# Altium footprint library PcbLib1.PcbLib: 17 footprints (part 1 of 2)
Each footprint in its own frame and in the unit in brackets; x right, y up, seen from the top. Pads: shape width x height; smd on the part's side, far side on the other; paste and mask are expansions set on the pad; w line width, h text height; cw(c..) or ccw(c..) is an arc to the next point about the centre after c.
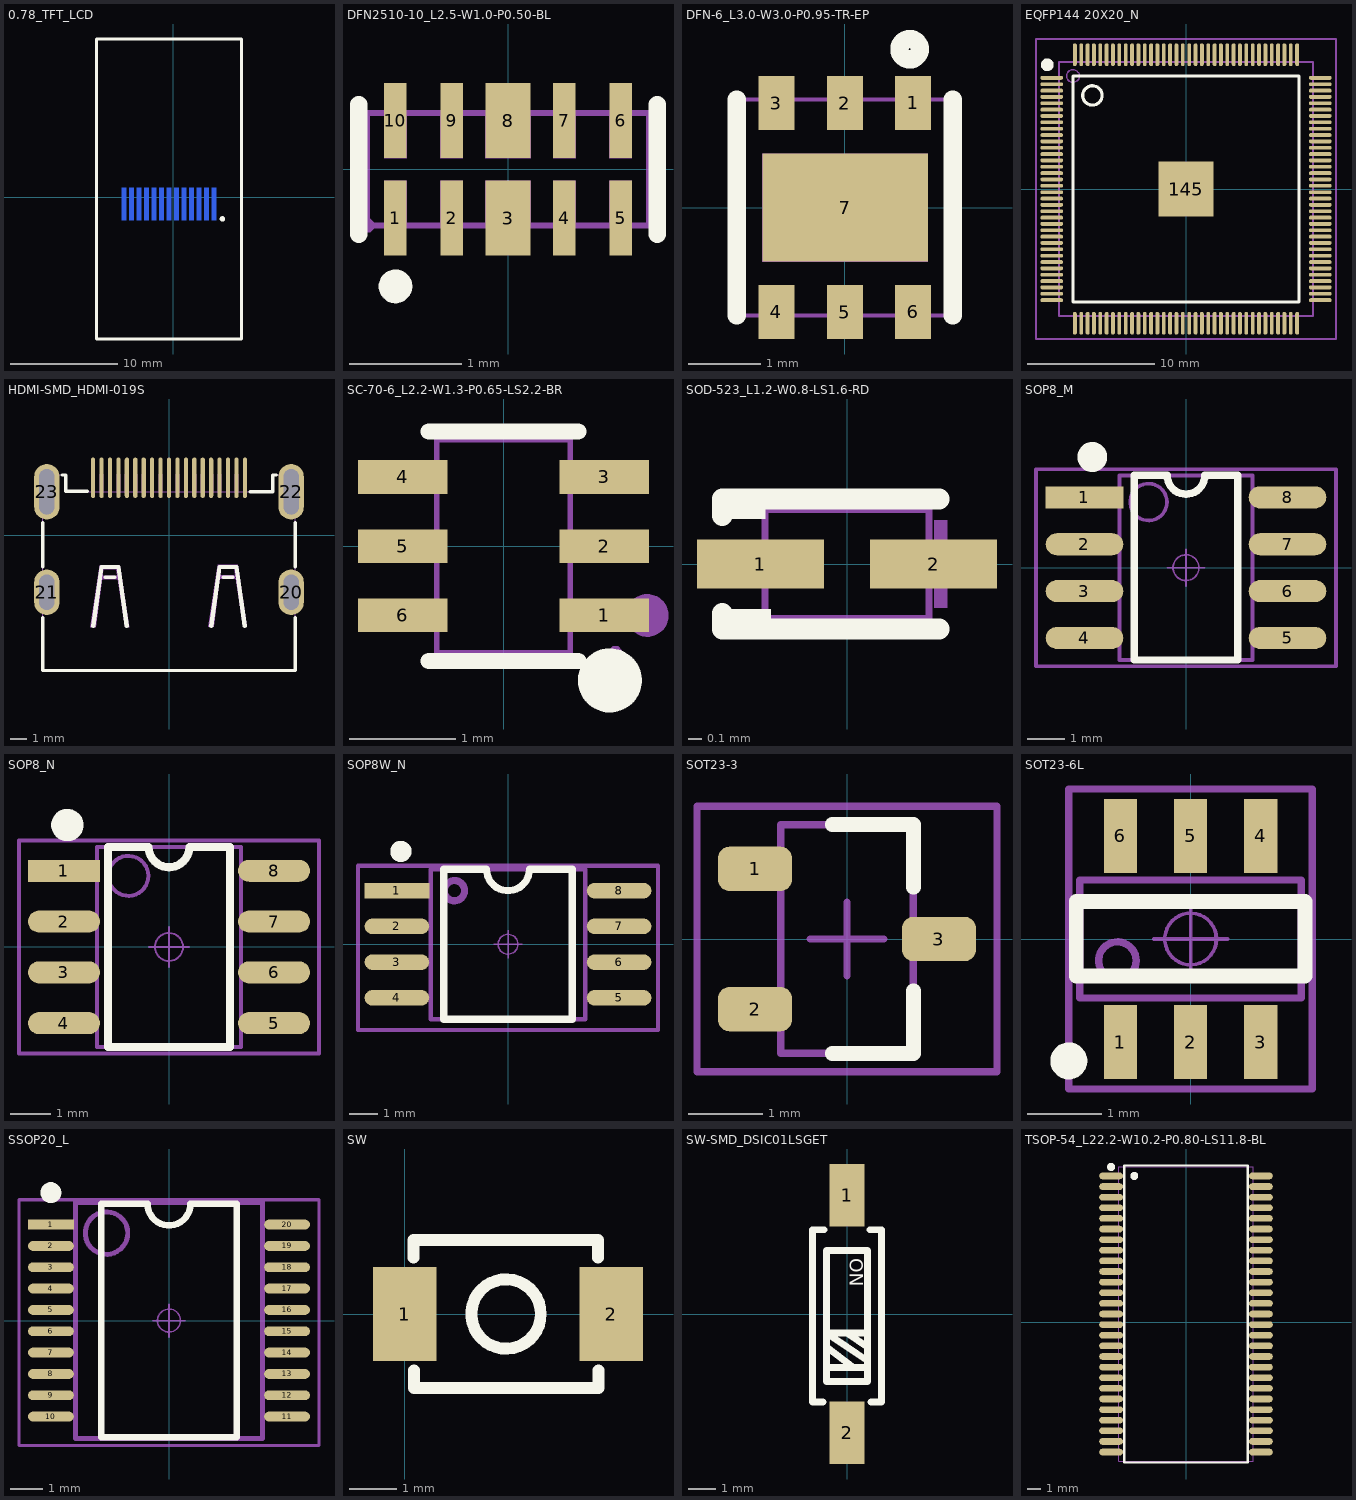
[diagram p0: the footprints below, top view; thin cyan lines are the x and y axes]

## 0.78_TFT_LCD [mm]
pads (13):
  rect 0.4x3 smd far side: 1(3.8,-0.635) 2(3.1,-0.635) 3(2.4,-0.635) 4(1.7,-0.635) 5(1,-0.635) 6(0.3,-0.635) 7(-0.4,-0.635) 8(-1.1,-0.635) 9(-1.8,-0.635) 10(-2.5,-0.635) 11(-3.2,-0.635) 12(-3.9,-0.635) 13(-4.6,-0.635)
Top Overlay:
  circle w0.254: c4.572,-2.032 r0.127
  lines w0.254: -7.15,-13.218 6.35,-13.218 6.35,14.732 -7.15,14.732 -7.15,-13.218

## DFN2510-10_L2.5-W1.0-P0.50-BL [mm]
pads (10):
  rect 0.2x0.665 smd paste-100 mask+0.051: 1(-1,-0.433) 2(-0.5,-0.433) 4(0.5,-0.433) 5(1,-0.433) 6(1,0.433) 7(0.5,0.433) 9(-0.5,0.433) 10(-1,0.433)
  rect 0.4x0.665 smd paste-100 mask+0.051: 3(0,-0.433) 8(0,0.433)
Top Overlay:
  circle w0.15: c-1,-1.04 r0.075
  lines w0.152: -1.326,-0.576 -1.326,0.576 ; 1.326,-0.576 1.326,0.576
Top Paste:
  region: -0.2,-0.1 0.2,-0.1 0.2,-0.765 -0.2,-0.765 -0.2,-0.766
  region: -0.2,0.765 0.2,0.765 0.2,0.1 -0.2,0.1
  region: -0.601,-0.1 -0.4,-0.1 -0.4,-0.765 -0.6,-0.765
  region: -1.101,-0.1 -0.9,-0.1 -0.9,-0.765 -1.1,-0.765
  region: 0.399,-0.1 0.6,-0.1 0.6,-0.765 0.4,-0.765
  region: 0.899,-0.1 1.1,-0.1 1.1,-0.765 0.9,-0.765
  region: 0.899,0.765 1.1,0.765 1.1,0.101 0.9,0.101
  region: 0.399,0.765 0.6,0.765 0.6,0.101 0.4,0.101
  region: -0.601,0.765 -0.4,0.765 -0.4,0.101 -0.6,0.101
  region: -1.101,0.765 -0.9,0.765 -0.9,0.101 -1.1,0.101
Mechanical 15:
  region: -0.2,-0.1 0.2,-0.1 0.2,-0.5 -0.2,-0.5
  region: -0.2,0.5 0.2,0.5 0.2,0.1 -0.2,0.1
  region: -1.1,0.5 -1.1,0.1 -0.9,0.1 -0.9,0.5
  region: -0.6,0.5 -0.6,0.1 -0.4,0.1 -0.4,0.5
  region: 0.4,0.5 0.4,0.1 0.6,0.1 0.6,0.5
  region: 0.9,0.5 0.9,0.1 1.1,0.1 1.1,0.5
  region: 0.9,-0.5 0.9,-0.1 1.1,-0.1 1.1,-0.5
  region: 0.4,-0.5 0.4,-0.1 0.6,-0.1 0.6,-0.5
  region: -0.6,-0.5 -0.6,-0.1 -0.4,-0.1 -0.4,-0.5
  region: -1.1,-0.5 -1.1,-0.1 -0.9,-0.1 -0.9,-0.5
  region: -1.19,-0.5 -1.19,-0.475 -1.225,-0.44 -1.275,-0.44 -1.31,-0.475 -1.31,-0.5 -1.31,-0.525 -1.275,-0.56 -1.225,-0.56 -1.19,-0.525 -1.19,-0.5
  lines w0.051: -1.25,-0.5 1.25,-0.5 1.25,0.5 -1.25,0.5 -1.25,-0.5
3D body "3D_PCB1_2023-04-28.stp": height 0.52, standoff 0, extent -1.25,-0.508 1.25,0.512

## DFN-6_L3.0-W3.0-P0.95-TR-EP [mm]
pads (7):
  rect 0.5x0.75 smd paste+0 mask+0.051: 1(0.95,1.452) 2(0,1.451) 3(-0.95,1.45) 4(-0.95,-1.451) 5(0,-1.452) 6(0.95,-1.451)
  rect 2.3x1.5 smd paste+0 mask+0.051: 7(0.004,-0.001)
Top Overlay:
  circle w0.254: c0.9,2.2 r0.141
  lines w0.254: -1.5,-1.5 -1.5,1.5 ; 1.5,-1.5 1.5,1.5
Mechanical 15:
  region: -0.192,1.499 0.208,1.499 0.208,1.099 -0.192,1.099
  region: 0.758,1.499 1.158,1.499 1.158,1.099 0.758,1.099
  region: -1.142,1.499 -0.742,1.499 -0.742,1.099 -1.142,1.099
  region: 1.15,-1.5 0.75,-1.5 0.75,-1.1 1.15,-1.1
  region: -0.75,-1.5 -1.15,-1.5 -1.15,-1.1 -0.75,-1.1
  region: 0.2,-1.5 -0.2,-1.5 -0.2,-1.1 0.2,-1.1
  region: -1.146,-0.751 -1.146,0.75 1.154,0.75 1.154,-0.751
  region: 1.56,1.5 1.56,1.525 1.525,1.56 1.475,1.56 1.44,1.525 1.44,1.5 1.44,1.475 1.475,1.44 1.525,1.44 1.56,1.475 1.56,1.5
  lines w0.051: -1.5,-1.5 -1.5,1.5 1.5,1.5 1.5,-1.5 -1.5,-1.5
3D body "3D_PCB1_2023-04-28.stp": height 1.01, standoff 0, extent -1.495,-1.507 1.485,1.493

## EQFP144 20X20_N [mm] "144脚，体宽20x20mm，脚距0.5mm"
pads (145):
  oval 1.8x0.3 smd: 1(-10.573,8.75) 2(-10.573,8.25) 3(-10.573,7.75) 4(-10.573,7.25) 5(-10.573,6.75) 6(-10.573,6.25) 7(-10.573,5.75) 8(-10.573,5.25) 9(-10.573,4.75) 10(-10.573,4.25) 11(-10.573,3.75) 12(-10.573,3.25) 13(-10.573,2.75) 14(-10.573,2.25) 15(-10.573,1.75) 16(-10.573,1.25) 17(-10.573,0.75) 18(-10.573,0.25) 19(-10.573,-0.25) 20(-10.573,-0.75) 21(-10.573,-1.25) 22(-10.573,-1.75) 23(-10.573,-2.25) 24(-10.573,-2.75) 25(-10.573,-3.25) 26(-10.573,-3.75) 27(-10.573,-4.25) 28(-10.573,-4.75) 29(-10.573,-5.25) 30(-10.573,-5.75) 31(-10.573,-6.25) 32(-10.573,-6.75) 33(-10.573,-7.25) 34(-10.573,-7.75) 35(-10.573,-8.25) 36(-10.573,-8.75) 73(10.573,-8.75) 74(10.573,-8.25) 75(10.573,-7.75) 76(10.573,-7.25) 77(10.573,-6.75) 78(10.573,-6.25) 79(10.573,-5.75) 80(10.573,-5.25) 81(10.573,-4.75) 82(10.573,-4.25) 83(10.573,-3.75) 84(10.573,-3.25) 85(10.573,-2.75) 86(10.573,-2.25) 87(10.573,-1.75) 88(10.573,-1.25) 89(10.573,-0.75) 90(10.573,-0.25) 91(10.573,0.25) 92(10.573,0.75) 93(10.573,1.25) 94(10.573,1.75) 95(10.573,2.25) 96(10.573,2.75) 97(10.573,3.25) 98(10.573,3.75) 99(10.573,4.25) 100(10.573,4.75) 101(10.573,5.25) 102(10.573,5.75) 103(10.573,6.25) 104(10.573,6.75) 105(10.573,7.25) 106(10.573,7.75) 107(10.573,8.25) 108(10.573,8.75)
  oval 0.3x1.8 smd: 37(-8.75,-10.573) 38(-8.25,-10.573) 39(-7.75,-10.573) 40(-7.25,-10.573) 41(-6.75,-10.573) 42(-6.25,-10.573) 43(-5.75,-10.573) 44(-5.25,-10.573) 45(-4.75,-10.573) 46(-4.25,-10.573) 47(-3.75,-10.573) 48(-3.25,-10.573) 49(-2.75,-10.573) 50(-2.25,-10.573) 51(-1.75,-10.573) 52(-1.25,-10.573) 53(-0.75,-10.573) 54(-0.25,-10.573) 55(0.25,-10.573) 56(0.75,-10.573) 57(1.25,-10.573) 58(1.75,-10.573) 59(2.25,-10.573) 60(2.75,-10.573) 61(3.25,-10.573) 62(3.75,-10.573) 63(4.25,-10.573) 64(4.75,-10.573) 65(5.25,-10.573) 66(5.75,-10.573) 67(6.25,-10.573) 68(6.75,-10.573) 69(7.25,-10.573) 70(7.75,-10.573) 71(8.25,-10.573) 72(8.75,-10.573) 109(8.75,10.573) 110(8.25,10.573) 111(7.75,10.573) 112(7.25,10.573) 113(6.75,10.573) 114(6.25,10.573) 115(5.75,10.573) 116(5.25,10.573) 117(4.75,10.573) 118(4.25,10.573) 119(3.75,10.573) 120(3.25,10.573) 121(2.75,10.573) 122(2.25,10.573) 123(1.75,10.573) 124(1.25,10.573) 125(0.75,10.573) 126(0.25,10.573) 127(-0.25,10.573) 128(-0.75,10.573) 129(-1.25,10.573) 130(-1.75,10.573) 131(-2.25,10.573) 132(-2.75,10.573) 133(-3.25,10.573) 134(-3.75,10.573) 135(-4.25,10.573) 136(-4.75,10.573) 137(-5.25,10.573) 138(-5.75,10.573) 139(-6.25,10.573) 140(-6.75,10.573) 141(-7.25,10.573) 142(-7.75,10.573) 143(-8.25,10.573) 144(-8.75,10.573)
  rect 4.3x4.3 smd: 145(0,0)
Top Overlay:
  circle w0.254: c-7.366,7.366 r0.762
  circle w0.508: c-10.922,9.779 r0.25
  lines w0.254: -8.892,-8.89 8.89,-8.89 8.89,8.89 -8.892,8.89 -8.892,-8.89
Mechanical 13:
  circle w0.1: c-8.894,8.894 r0.5
  lines w0.15: -10,-10 -10,10 10,10 10,-10 -10,-10
Mechanical 15:
  circle w0.05: c0,0 r0.35
  lines w0.05: -0.5,0 0.5,0 ; 0,-0.5 0,0.5
  lines w0.15: -11.811,-11.811 11.811,-11.811 11.811,11.811 -11.811,11.811 -11.811,-11.811
3D body "LQFP144-20x20.STEP": height 1.45, standoff -0.01, extent -11.003,-11.003 11.003,11.003

## HDMI-SMD_HDMI-019S [mm]
pads (23):
  oval 0.25x2.4 smd paste-100 mask+0.051: 1(4.501,3.396) 2(4.001,3.396) 3(3.501,3.396) 4(3.001,3.396) 5(2.5,3.396) 6(2,3.396) 7(1.5,3.396) 8(1,3.396) 9(0.5,3.396) 10(0,3.396) 11(-0.5,3.396) 12(-1,3.396) 13(-1.5,3.396) 14(-2,3.396) 15(-2.5,3.396) 16(-3.001,3.396) 17(-3.501,3.396) 18(-4.001,3.396) 19(-4.501,3.396)
  oval 1.5x2.7 hole 0.9 slot 2.1 at 90 deg copper offset 0.001,-0.001 paste+0 mask+0.051: 20(7.249,-3.395)
  oval 1.5x2.7 hole 0.9 slot 2.1 at 90 deg copper offset -0.001,-0.001 paste+0 mask+0.051: 21(-7.249,-3.395)
  oval 1.5x3.3 hole 0.9 slot 2.7 at 90 deg copper offset 0.001,-0.001 paste+0 mask+0.051: 22(7.249,2.564)
  oval 1.5x3.3 hole 0.9 slot 2.7 at 90 deg copper offset -0.001,-0.001 paste+0 mask+0.051: 23(-7.249,2.564)
Top Overlay:
  lines w0.2: -7.5,-4.917 -7.5,-8.036 7.5,-8.036 7.5,-4.917 ; -7.5,-1.875 -7.5,0.743 ; -6.35,3.557 -6.107,3.557 -6.107,3.545 -6.12,3.545 -6.12,2.592 -4.837,2.592 ; -3.8,-2.504 -3.2,-2.504 ; 3.2,-2.504 3.8,-2.504 ; 4.83,2.565 6.08,2.565 6.08,2.575 6.145,2.575 6.145,3.563 6.352,3.563 6.352,3.556 ; 7.5,-1.876 7.5,0.743
  lines w0.254: -4.5,-5.404 -4,-1.904 -3,-1.904 -2.5,-5.404 ; 2.5,-5.404 3,-1.904 4,-1.904 4.5,-5.404
Top Paste:
  drawing of 23 lines, arcs and shapes, not listed
Mechanical 6:
  region: -4.666,-5.486 -4.356,-5.486 -3.914,-2.052 -3.123,-2.043 -2.606,-5.495 -2.371,-5.477 -2.916,-1.789 -4.102,-1.789
  region: -3.951,-2.419 -3.114,-2.4 -3.067,-2.636 -3.961,-2.645
  region: 3.047,-2.381 3.884,-2.362 3.931,-2.598 3.037,-2.607
  region: 2.332,-5.448 2.642,-5.448 3.084,-2.014 3.875,-2.005 4.392,-5.457 4.627,-5.439 4.082,-1.751 2.896,-1.751
Mechanical 15:
  region: 7.56,3.596 7.56,3.621 7.525,3.656 7.475,3.656 7.44,3.621 7.44,3.596 7.44,3.571 7.475,3.536 7.525,3.536 7.56,3.571 7.56,3.596
  region: -4.611,3.596 -4.391,3.596 -4.391,2.496 -4.611,2.496
  region: -4.111,3.596 -3.891,3.596 -3.891,2.496 -4.111,2.496
  region: -3.611,3.596 -3.391,3.596 -3.391,2.496 -3.611,2.496
  region: -3.111,3.596 -2.891,3.596 -2.891,2.496 -3.111,2.496
  region: -2.61,3.596 -2.39,3.596 -2.39,2.496 -2.61,2.496
  region: -2.11,3.596 -1.89,3.596 -1.89,2.496 -2.11,2.496
  region: -1.61,3.596 -1.39,3.596 -1.39,2.496 -1.61,2.496
  region: -1.11,3.596 -0.89,3.596 -0.89,2.496 -1.11,2.496
  region: -0.61,3.596 -0.39,3.596 -0.39,2.496 -0.61,2.496
  region: 3.891,3.596 4.111,3.596 4.111,2.496 3.891,2.496
  region: 3.391,3.596 3.611,3.596 3.611,2.496 3.391,2.496
  region: 2.891,3.596 3.111,3.596 3.111,2.496 2.891,2.496
  region: 2.39,3.596 2.61,3.596 2.61,2.496 2.39,2.496
  region: 1.89,3.596 2.11,3.596 2.11,2.496 1.89,2.496
  region: 1.39,3.596 1.61,3.596 1.61,2.496 1.39,2.496
  region: 0.89,3.596 1.11,3.596 1.11,2.496 0.89,2.496
  region: 0.39,3.596 0.61,3.596 0.61,2.496 0.39,2.496
  region: -0.11,3.596 0.11,3.596 0.11,2.496 -0.11,2.496
  region: 7,3.564 7.5,3.564 7.5,1.564 7,1.564
  region: -7.5,3.564 -7,3.564 -7,1.564 -7.5,1.564
  region: -7.5,-2.896 -7,-2.896 -7,-3.896 -7.5,-3.896
  region: 7,-2.896 7.5,-2.896 7.5,-3.896 7,-3.896
  region: 4.391,3.596 4.611,3.596 4.611,2.496 4.391,2.496
  lines w0.051: -7.5,-8.036 7.5,-8.036 7.5,3.564 6.1,3.564 6.1,2.567 -6.1,2.567 -6.1,3.564 -7.5,3.564 -7.5,-8.036
3D body "3D_PCB1_2023-04-28.stp": height 5.71, standoff -2.3, extent -7.493,-7.982 7.507,3.918

## SC-70-6_L2.2-W1.3-P0.65-LS2.2-BR [mm]
pads (6):
  rect 0.841x0.315 smd mask+0.051: 1(0.946,-0.65) 2(0.946,0) 3(0.946,0.65) 4(-0.946,0.65) 5(-0.946,0) 6(-0.946,-0.65)
Top Overlay:
  circle w0.3: c0.998,-1.26 r0.15
  lines w0.152: -0.701,-1.076 0.701,-1.076 ; -0.701,1.076 0.701,1.076
Mechanical 6:
  circle w0.2: c1.35,-0.65 r0.1
Mechanical 15:
  region: 1.11,-1 1.11,-0.975 1.075,-0.94 1.025,-0.94 0.99,-0.975 0.99,-1 0.99,-1.025 1.025,-1.06 1.075,-1.06 1.11,-1.025 1.11,-1
  region: 0.69,-0.763 0.69,-0.537 1.05,-0.537 1.05,-0.763
  region: 0.615,-0.763 0.615,-0.537 0.7,-0.537 0.7,-0.763
  region: 0.69,-0.112 0.69,0.112 1.05,0.112 1.05,-0.112
  region: 0.615,-0.112 0.615,0.112 0.7,0.112 0.7,-0.112
  region: 0.69,0.537 0.69,0.763 1.05,0.763 1.05,0.537
  region: 0.615,0.537 0.615,0.763 0.7,0.763 0.7,0.537
  region: -0.69,0.537 -0.69,0.763 -1.05,0.763 -1.05,0.537
  region: -0.7,0.537 -0.7,0.763 -0.615,0.763 -0.615,0.537
  region: -0.69,-0.112 -0.69,0.112 -1.05,0.112 -1.05,-0.112
  region: -0.7,-0.112 -0.7,0.112 -0.615,0.112 -0.615,-0.112
  region: -0.69,-0.763 -0.69,-0.537 -1.05,-0.537 -1.05,-0.763
  region: -0.7,-0.763 -0.7,-0.537 -0.615,-0.537 -0.615,-0.763
  lines w0.051: -0.625,-1 -0.625,1 0.625,1 0.625,-1 -0.625,-1
3D body "3D_PCB1_2023-04-03.stp": height 1, standoff 0, extent -1.051,-1.009 1.049,0.991

## SOD-523_L1.2-W0.8-LS1.6-RD [mm]
pads (2):
  rect 0.93x0.36 smd mask+0.051: 1(-0.635,0) 2(0.635,0)
Top Overlay:
  region: -0.56,-0.552 -0.56,-0.332 -0.864,-0.332 -0.864,-0.552
  region: -0.6,0.552 -0.6,0.332 -0.905,0.332 -0.905,0.552
  lines w0.152: -0.914,-0.363 -0.914,-0.476 -0.676,-0.476 0.676,-0.476 ; -0.914,0.356 -0.914,0.476 -0.676,0.476 0.676,0.476
Mechanical 6:
  region: 0.736,0.32 0.736,-0.32 0.64,-0.32 0.64,0.32
  region: 0.88,0.048 0.88,-0.048 0.496,-0.048 0.496,0.048
  region: -0.887,0.055 -0.887,-0.041 -0.503,-0.041 -0.503,0.055
Mechanical 15:
  region: 0.8,-0.15 0.8,0.15 0.2,0.15 0.2,-0.15
  region: -0.8,-0.15 -0.8,0.15 -0.2,0.15 -0.2,-0.15
  region: -0.74,-0.4 -0.74,-0.375 -0.775,-0.34 -0.825,-0.34 -0.86,-0.375 -0.86,-0.4 -0.86,-0.425 -0.825,-0.46 -0.775,-0.46 -0.74,-0.425 -0.74,-0.4
  lines w0.051: -0.6,-0.4 0.6,-0.4 0.6,0.4 -0.6,0.4 -0.6,-0.4
3D body "3D_PCB1_2023-01-14.stp": height 0.68, standoff -0.03, extent -0.901,-0.397 0.699,0.403

## SOP8_M [mm] "5*6*1.8mm（长宽高）"
height 1.75
pads (8):
  rect 2.1x0.6 smd: 1(-2.75,1.905)
  oval 2.1x0.6 smd: 2(-2.75,0.635) 3(-2.75,-0.635) 4(-2.75,-1.905) 5(2.75,-1.905) 6(2.75,-0.635) 7(2.75,0.635) 8(2.75,1.905)
Top Overlay:
  circle w0.5: c-2.54,3 r0.155
  lines w0.2: -1.397,2.5 -1.397,-2.5 1.397,-2.5 1.397,2.5
  lines w0.203: -1.397,2.5 -0.508,2.5 ccw(c0,2.5) 0,1.992 ccw(c0,2.5) 0.508,2.5 1.397,2.5
Mechanical 13:
  circle w0.1: c-1.016,1.778 r0.5
  lines w0.1: -1.8,-2.5 -1.8,2.5 1.8,2.5 1.8,-2.5 -1.8,-2.5
Mechanical 15:
  circle w0.05: c0,0 r0.35
  lines w0.05: -0.5,0 0.5,0 ; 0,-0.5 0,0.5
  lines w0.1: -4.064,-2.667 -4.064,2.667 4.064,2.667 4.064,-2.667 -4.064,-2.667
3D body "SOP8.STEP": height 1.9, standoff 0, extent -3.003,-2.5 3.003,2.5

## SOP8_N [mm] "5*6*1.8mm（长宽高）"
height 1.75
pads (8):
  rect 1.8x0.55 smd: 1(-2.625,1.905)
  oval 1.8x0.55 smd: 2(-2.625,0.635) 3(-2.625,-0.635) 4(-2.625,-1.905) 5(2.625,-1.905) 6(2.625,-0.635) 7(2.625,0.635) 8(2.625,1.905)
Top Overlay:
  circle w0.5: c-2.54,3.048 r0.155
  lines w0.2: -1.524,2.5 -1.524,-2.5 1.524,-2.5 1.524,2.5
  lines w0.203: -1.524,2.5 -0.508,2.5 ccw(c0,2.5) 0,1.992 ccw(c0,2.5) 0.508,2.5 1.524,2.5
Mechanical 13:
  circle w0.1: c-1.016,1.778 r0.5
  lines w0.1: -1.8,-2.5 -1.8,2.5 1.8,2.5 1.8,-2.5 -1.8,-2.5
Mechanical 15:
  circle w0.05: c0,0 r0.35
  lines w0.05: -0.5,0 0.5,0 ; 0,-0.5 0,0.5
  lines w0.1: -3.75,-2.667 3.75,-2.667 3.75,2.667 -3.75,2.667 -3.75,-2.667
3D body "SOP8.STEP": height 1.9, standoff 0, extent -3.003,-2.5 3.003,2.5

## SOP8W_N [mm] "5.3*8.3*1.8mm（长宽高）"
pads (8):
  rect 2.3x0.55 smd: 1(-3.95,1.905)
  oval 2.3x0.55 smd: 2(-3.95,0.635) 3(-3.95,-0.635) 4(-3.95,-1.905) 5(3.95,-1.905) 6(3.95,-0.635) 7(3.95,0.635) 8(3.95,1.905)
Top Overlay:
  circle w0.5: c-3.81,3.302 r0.127
  lines w0.254: -2.286,-2.667 2.286,-2.667 2.286,2.667 0.762,2.667 cw(c0,2.667) -0.762,2.667 -2.286,2.667 -2.286,-2.667
Mechanical 13:
  circle w0.254: c-1.905,1.905 r0.359
  lines w0.15: -2.75,-2.667 2.75,-2.667 2.75,2.667 -2.75,2.667 -2.75,-2.667
Mechanical 15:
  circle w0.05: c0,0 r0.35
  lines w0.05: -0.5,0 0.5,0 ; 0,-0.5 0,0.5
  lines w0.15: -5.334,-3.048 -5.334,2.794 5.334,2.794 5.334,-3.048 -5.334,-3.048
3D body "SOP8W.STEP": height 1.9, standoff 0, extent -3.943,-2.64 3.943,2.64

## SOT23-3 [mm] "SOT23, 3-Leads, Body 3.1x3.0mm (max), Pitch 0.95mm, IPC Medium Density"
height 1.2
pads (3):
  rrect50% 1x0.6 smd: 1(-1.246,0.95) 2(-1.246,-0.95) 3(1.246,0)
Top Overlay:
  lines w0.2: -0.2,-1.55 0.9,-1.55 0.9,-0.7 ; -0.2,1.55 0.9,1.55 0.9,0.7
Mechanical 13:
  lines w0.1: -0.9,-1.55 0.9,-1.55 0.9,1.55 -0.9,1.55 -0.9,-1.55
Mechanical 15:
  lines w0.1: -0.5,0 0.5,0 ; 0,-0.5 0,0.5 ; -2.032,-1.8 2.032,-1.8 2.032,1.8 -2.032,1.8 -2.032,-1.8
3D body "SOT-23-3.stp": height 1.2, standoff 0, extent -1.298,-1.45 1.502,1.45

## SOT23-6L [mm] "3x1.6x1.1mm(长宽高)"
height 1.45
pads (6):
  rect 0.45x1 smd: 1(-0.95,-1.397) 2(0,-1.397) 3(0.95,-1.397) 4(0.95,1.397) 5(0,1.397) 6(-0.95,1.397)
Top Overlay:
  circle w0.25: c-1.65,-1.651 r0.125
  lines w0.2: -1.55,-0.5 -1.55,0.508 1.55,0.508 1.55,-0.5 -1.55,-0.5
Mechanical 13:
  circle w0.1: c-0.992,-0.292 r0.254
  lines w0.1: -1.5,-0.8 1.5,-0.8 1.5,0.8 -1.5,0.8 -1.5,-0.8
Mechanical 15:
  circle w0.05: c0,0 r0.35
  lines w0.05: -0.5,0 0.5,0 ; 0,-0.5 0,0.5
  lines w0.1: -1.65,-2.032 1.65,-2.032 1.65,2.032 -1.65,2.032 -1.65,-2.032
3D body "SOT23-6.STEP": height 1.15, standoff -0.03, extent -1.5,-1.404 1.5,1.403

## SSOP20_L [mm] "7.2*7.8*1.6（长宽高）"
pads (20):
  rect 1.4x0.3 smd: 1(-3.6,2.925)
  oval 1.4x0.3 smd: 2(-3.6,2.275) 3(-3.6,1.625) 4(-3.6,0.975) 5(-3.6,0.325) 6(-3.6,-0.325) 7(-3.6,-0.975) 8(-3.6,-1.625) 9(-3.6,-2.275) 10(-3.6,-2.925) 11(3.6,-2.925) 12(3.6,-2.275) 13(3.6,-1.625) 14(3.6,-0.975) 15(3.6,-0.325) 16(3.6,0.325) 17(3.6,0.975) 18(3.6,1.625) 19(3.6,2.275) 20(3.6,2.925)
Top Overlay:
  circle w0.381: c-3.6,3.9 r0.127
  lines w0.2: -2.065,-3.556 2.065,-3.556 2.065,3.556 0.655,3.556 cw(c0,3.556) -0.655,3.556 -2.065,3.556 -2.065,-3.556
Mechanical 13:
  circle w0.15: c-1.905,2.667 r0.648
  lines w0.15: -2.85,-3.6 2.85,-3.6 2.85,3.6 -2.85,3.6 -2.85,-3.6
Mechanical 15:
  circle w0.05: c0,0 r0.35
  lines w0.05: -0.5,0 0.5,0 ; 0,-0.5 0,0.5
  lines w0.1: -4.572,-3.81 -2.667,-3.81 4.572,-3.81 4.572,3.683 -4.572,3.683 -4.572,-3.81
3D body "SSOP20.STEP": height 1.65, standoff -0.03, extent -3.852,-3.6 3.852,3.6

## SW [mm]
pads (2):
  rect 1.35x2 smd mask+0.051: 1(0,0) 2(4.4,0)
Top Overlay:
  circle w0.254: c2.159,0 r0.741
  lines w0.254: 0.184,1.2 0.184,1.569 ; 0.184,1.581 4.121,1.581 ; 0.197,-1.581 4.134,-1.581 ; 0.197,-1.569 0.197,-1.2 ; 4.121,1.2 4.121,1.569 ; 4.134,-1.569 4.134,-1.2
3D body "User Library-342button.STEP": height 2, standoff 0, extent -0.341,-1.476 4.659,1.524

## SW-SMD_DSIC01LSGET [mm]
pads (2):
  rect 1.3x2.3 smd paste+0 mask+0.051: 1(0,4.375) 2(0,-4.375)
Top Overlay:
  lines w0.254: -0.881,-3.245 -1.27,-3.245 -1.27,3.105 -0.847,3.105 ; -0.762,-1.975 0.762,-1.975 ; -0.762,-1.213 0.254,-1.975 ; 0,-0.705 0.762,-1.213 ; 0.762,-1.721 -0.762,-0.705 0.762,-0.705 ; 0.847,3.105 1.27,3.105 1.27,-3.245 0.881,-3.245 ; -0.762,-2.483 -0.762,2.343 0.762,2.343 0.762,-2.483 -0.762,-2.483
  text "ON" at 0.106,2.053 h0.49
Mechanical 15:
  region: -0.3,-4.65 -0.3,-3.85 0.3,-3.85 0.3,-4.65
  region: -0.3,3.85 -0.3,4.65 0.3,4.65 0.3,3.85
  lines w0.051: -1.27,-3 -1.27,3 ; 1.27,-3 1.27,3
3D body "3D_PCB1_2023-04-28.stp": height 3.85, standoff 0, extent -1.271,-4.65 1.27,4.65

## TSOP-54_L22.2-W10.2-P0.80-LS11.8-BL [mm]
pads (54):
  oval 1.8x0.5 smd paste+0 mask+0.051: 1(-5.642,11.035) 2(-5.642,10.235) 3(-5.642,9.435) 4(-5.642,8.635) 5(-5.642,7.835) 6(-5.642,7.035) 7(-5.642,6.235) 8(-5.642,5.435) 9(-5.642,4.635) 10(-5.642,3.835) 11(-5.642,3.035) 12(-5.642,2.235) 13(-5.642,1.435) 14(-5.642,0.635) 15(-5.642,-0.165) 16(-5.642,-0.965) 17(-5.642,-1.765) 18(-5.642,-2.565) 19(-5.642,-3.365) 20(-5.642,-4.165) 21(-5.642,-4.965) 22(-5.642,-5.765) 23(-5.642,-6.565) 24(-5.642,-7.365) 25(-5.642,-8.165) 26(-5.642,-8.965) 27(-5.642,-9.765) 28(5.642,-9.765) 29(5.642,-8.965) 30(5.642,-8.165) 31(5.642,-7.365) 32(5.642,-6.565) 33(5.642,-5.765) 34(5.642,-4.965) 35(5.642,-4.165) 36(5.642,-3.365) 37(5.642,-2.565) 38(5.642,-1.765) 39(5.642,-0.965) 40(5.642,-0.165) 41(5.642,0.635) 42(5.642,1.435) 43(5.642,2.235) 44(5.642,3.035) 45(5.642,3.835) 46(5.642,4.635) 47(5.642,5.435) 48(5.642,6.235) 49(5.642,7.035) 50(5.642,7.835) 51(5.642,8.635) 52(5.642,9.435) 53(5.642,10.235) 54(5.642,11.035)
Top Overlay:
  circle w0.3: c-3.899,11.035 r0.15
  circle w0.3: c-5.642,11.711 r0.15
  lines w0.152: -4.651,-10.551 4.651,-10.551 4.651,11.821 -4.651,11.821 -4.651,-10.551
Mechanical 15:
  drawing of 113 lines, arcs and shapes, not listed
3D body "3D_PCB1_2023-04-25.stp": height 1.1, standoff 0, extent -5.901,-10.433 5.891,11.729